# Altium footprint library THU VIEN PCB.PCBLib: 911 footprints (part 24 of 57)
Each footprint in its own frame and in the unit in brackets; x right, y up, seen from the top. Pads: shape width x height; smd on the part's side, far side on the other; paste and mask are expansions set on the pad; w line width, h text height; cw(c..) or ccw(c..) is an arc to the next point about the centre after c.
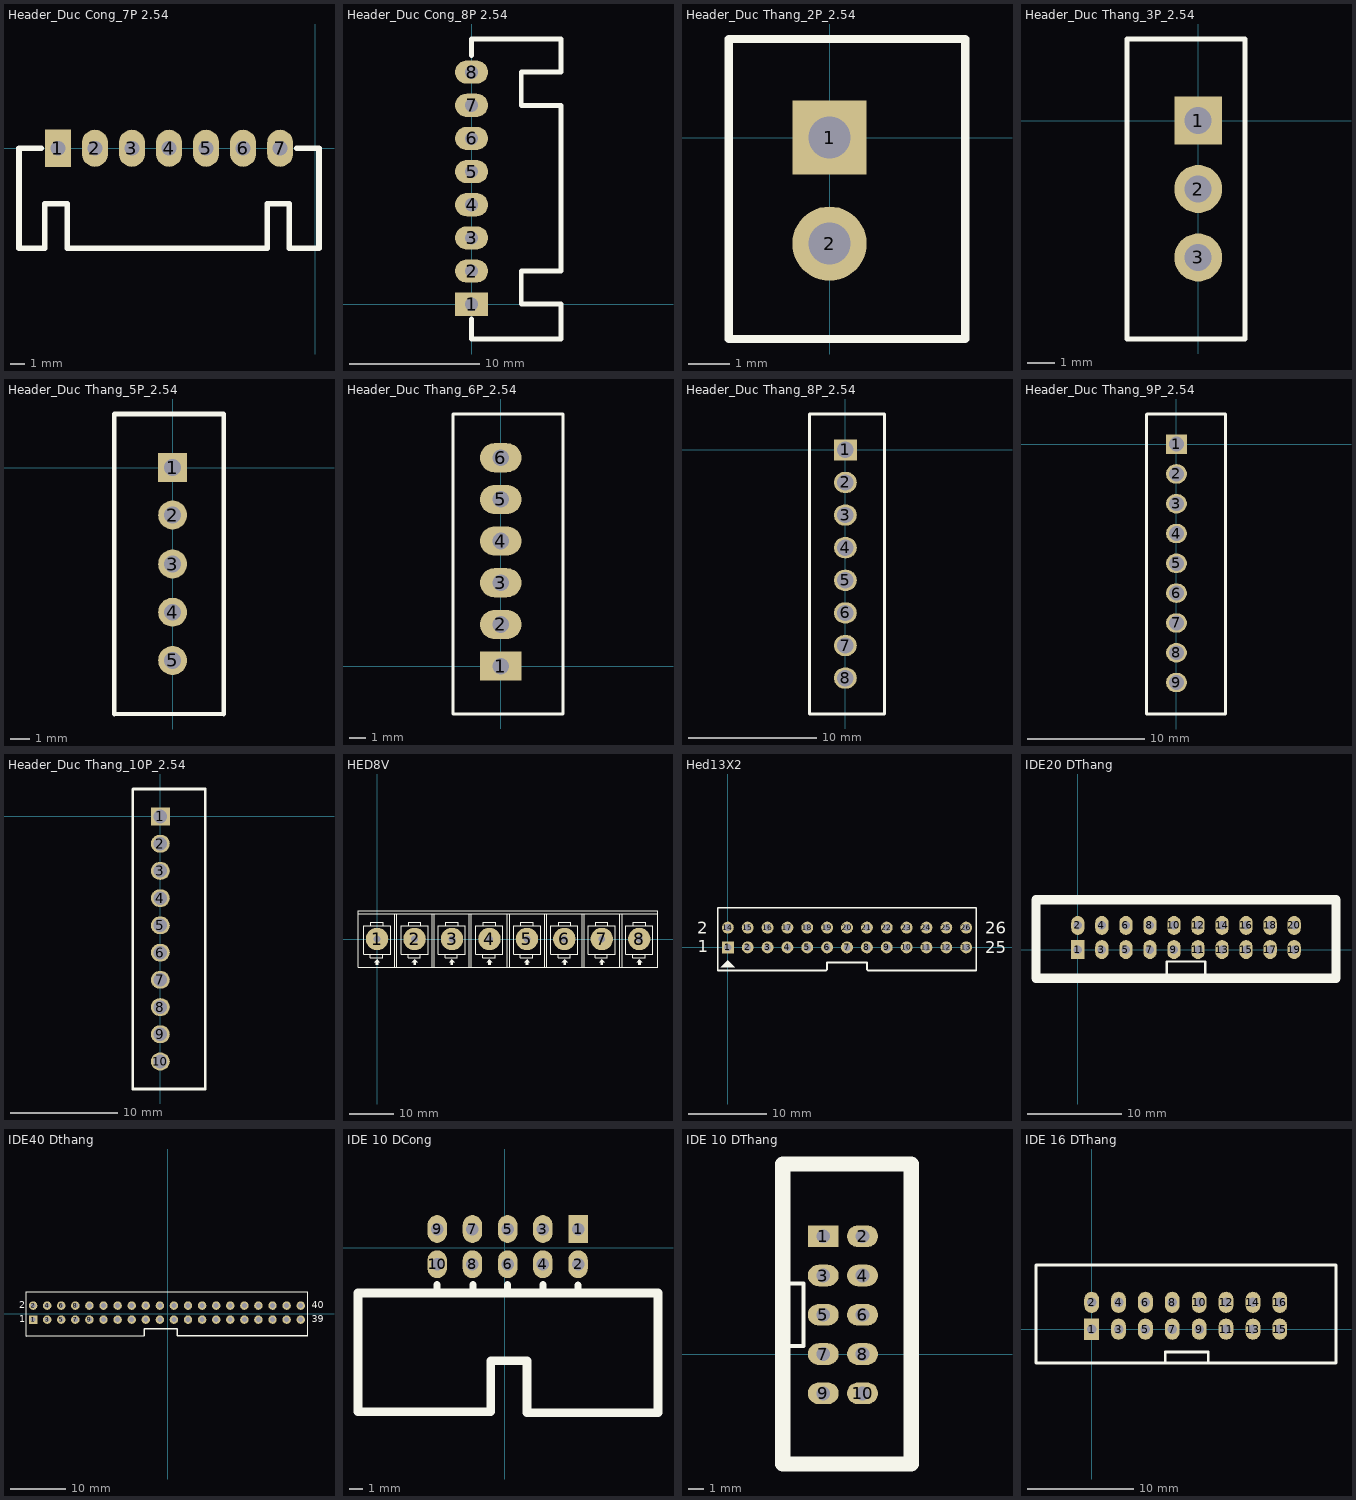
[diagram p23: the footprints below, top view; thin cyan lines are the x and y axes]

## Header_Duc Cong_7P 2.54 [mil]
pads (7):
  rect 70x100 hole 40: 1(-694.96,0)
  oval 70x100 hole 40: 2(-594.96,0) 3(-494.96,0) 4(-394.96,0) 5(-294.96,0) 6(-194.96,0) 7(-94.96,0)
Top Overlay:
  lines w15: -740,0 -800,0 -800,-270 -730,-270 -730,-150 -670,-150 -670,-270 -130,-270 -130,-150 -70,-150 -70,-270 10,-270 10,0 -50,0
3D body "header 7.stp": height 236.72, standoff 0.5, extent -788.7,-270.59 -1.3,5

## Header_Duc Cong_8P 2.54 [mil]
pads (8):
  rect 100x70 hole 40: 1(0,0)
  oval 100x70 hole 40: 2(0,100) 3(0,200) 4(0,300) 5(0,400) 6(0,500) 7(0,600) 8(0,700)
Top Overlay:
  lines w15: 0,-45.04 0,-105.04 270,-105.04 270,0 150,0 150,100 270,100 270,600 150,600 150,700 270,700 270,800 0,800 0,750

## Header_Duc Thang_2P_2.54 [mil]
pads (2):
  rect 70x70 hole 39.37 unplated: 1(0,0)
  round 70 hole 39.37 unplated: 2(0,-100)
Top Overlay:
  lines w7.87: -95,-190 -95,93 128,93 128,-190 -95,-190
3D body "Con 2.stp.step": height 236.82, standoff -133.26, extent -70,-160.14 107.16,72.14

## Header_Duc Thang_3P_2.54 [mil]
pads (3):
  rect 70x70 hole 39.37 unplated: 1(0,0)
  round 70 hole 39.37 unplated: 2(0,-100) 3(0,-200)
Top Overlay:
  lines w7.87: -104,-319 -104,119 68.31,119 68.31,-319 -104,-319

## Header_Duc Thang_5P_2.54 [mil]
pads (5):
  rect 60x60 hole 35: 1(0,0)
  round 60 hole 35: 2(0,-98.42) 3(0,-200) 4(0,-300) 5(0,-400)
Top Overlay:
  lines w7.87: -121,-511 106,-511
  lines w10: -121,-511 -121,111 106,111 106,-511
3D body "Header 5P Thang.stp": height 570, standoff -109, extent -119.5,-510 107,110

## Header_Duc Thang_6P_2.54 [mil] "Header 6P X2.54 Duc Thang"
pads (6):
  rect 100x70 hole 40: 1(0,0)
  oval 100x70 hole 40: 2(0,100) 3(0,200) 4(0,300) 5(0,400) 6(0,500)
Top Overlay:
  lines w7: -115,-115 -115,605 150,605 150,-115 -115,-115
3D body "31502.stp": height 549.5, standoff -129.5, extent -114.5,-115 112,605

## Header_Duc Thang_8P_2.54 [mil]
pads (8):
  rect 70x65 hole 50: 1(0,0)
  oval 70x65 hole 50: 2(0,-100) 3(0,-200) 4(0,-300) 5(0,-400) 6(0,-500) 7(0,-600) 8(0,-700)
Top Overlay:
  lines w10: -110,-810 -110,110 120,110 120,-810 -110,-810
3D body "Header 10 2.54 duc thang.stp": height 550, standoff -129, extent -110,-810 116.5,110

## Header_Duc Thang_9P_2.54 [mil]
pads (9):
  rect 70x65 hole 50: 1(0,0)
  oval 70x65 hole 50: 2(0,-100) 3(0,-200) 4(0,-300) 5(0,-400) 6(0,-500) 7(0,-600) 8(0,-700) 9(0,-800)
Top Overlay:
  lines w10: -101,-905.51 -101,99 -99,101 165,101 165,-905.51 -101,-905.51

## Header_Duc Thang_10P_2.54 [mil]
pads (10):
  rect 70x65 hole 50: 1(0,0)
  oval 70x65 hole 50: 2(0,-100) 3(0,-200) 4(0,-300) 5(0,-400) 6(0,-500) 7(0,-600) 8(0,-700) 9(0,-800) 10(0,-900)
Top Overlay:
  lines w10: -101,-1001 -101,99 -99,101 165,101 165,-1001 -101,-1001
3D body "31550.stp": height 550, standoff -115, extent -98,-1000 162,100

## HED8V [mil] "Header 6"
height 300
pads (8):
  round 200 hole 60: 1(0,0) 2(333.33,0) 3(666.67,0) 4(1000,0) 5(1333.33,0) 6(1666.67,0) 7(2000,0) 8(2333.33,0)
Top Overlay:
  drawing of 107 lines, arcs and shapes, not listed

## Hed13X2 [mil] "Header 13x2,26 pin, connecter"
pads (26):
  rect 60x60 hole 36: 1(0,0)
  round 60 hole 36: 2(100,0) 3(200,0) 4(300,0) 5(400,0) 6(500,0) 7(600,0) 8(700,0) 9(800,0) 10(900,0) 11(1000,0) 12(1100,0) 13(1200,0) 14(0,100) 15(100,100) 16(200,100) 17(300,100) 18(400,100) 19(500,100) 20(600,100) 21(700,100) 22(800,100) 23(900,100) 24(1000,100) 25(1100,100) 26(1200,100)
Top Overlay:
  region: 0,-65 -35,-100 35,-100
  lines w8: -50,-115 -50,200 1250,200 1250,-115
  lines w10: -50,-115 495,-115 500,-110 500,-75 700,-75 700,-110 705,-115 1250,-115
  text "1" at -150,-25 h60
  text "2" at -155,70 h60
  text "25" at 1295,-30 h60
  text "26" at 1295,70 h60

## IDE20 DThang [mm] "Connector; Header; 5x2 Position"
pads (20):
  rect 1.4x2 hole 0.9: 1(0,0)
  oval 1.4x2 hole 0.9: 2(0,2.54) 3(2.54,0) 4(2.54,2.54) 5(5.08,0) 6(5.08,2.54) 7(7.62,0) 8(7.62,2.54) 9(10.16,0) 10(10.16,2.54) 11(12.7,0) 12(12.7,2.54) 13(15.24,0) 14(15.24,2.54) 15(17.78,0) 16(17.78,2.54) 17(20.32,0) 18(20.32,2.54) 19(22.86,0) 20(22.86,2.54)
Top Overlay:
  lines w0.254: 9.398,-2.54 9.398,-1.27 13.462,-1.27 13.462,-2.794
  lines w1: 8.28,-3.048 27.28,-3.048 27.28,5.27 8.28,5.27 ; 14.58,-3.048 -4.42,-3.048 -4.42,5.27 14.58,5.27
3D body "User Library-HDB-20.step": height 9.3, standoff -2.5, extent -5.02,-3.63 27.88,5.77

## IDE40 Dthang [mil]
pads (40):
  rect 60x60 hole 35 unplated: 1(-955.2,-43.54)
  round 60 hole 35 unplated: 2(-955.2,56.46) 3(-855.2,-43.54) 4(-855.2,56.46) 5(-755.2,-43.54) 6(-755.2,56.46) 7(-655.2,-43.54) 8(-655.2,56.46) 9(-555.2,-43.54) 10(-555.2,56.46) 11(-455.2,-43.54) 12(-455.2,56.46) 13(-355.2,-43.54) 14(-355.2,56.46) 15(-255.2,-43.54) 16(-255.2,56.46) 17(-155.2,-43.54) 18(-155.2,56.46) 19(-55.2,-43.54) 20(-55.2,56.46) 21(44.8,-43.54) 22(44.8,56.46) 23(144.8,-43.54) 24(144.8,56.46) 25(244.8,-43.54) 26(244.8,56.46) 27(344.8,-43.54) 28(344.8,56.46) 29(444.8,-43.54) 30(444.8,56.46) 31(544.8,-43.54) 32(544.8,56.46) 33(644.8,-43.54) 34(644.8,56.46) 35(744.8,-43.54) 36(744.8,56.46) 37(844.8,-43.54) 38(844.8,56.46) 39(944.8,-43.54) 40(944.8,56.46)
Top Overlay:
  lines w7.87: -1005.2,-162.44 -1005.2,155.67 994.8,155.67 994.09,-157.48
  lines w10: -1005.2,-162.44 -167.32,-157.48 -167.32,-127.95 -167.32,-108.27 68.9,-108.27 68.9,-157.48 994.09,-157.48
  text "1" at -1055.2,-63.54 h50
  text "2" at -1055.2,36.46 h50
  text "40" at 1024.8,36.46 h50
  text "39" at 1024.8,-63.54 h50

## IDE 10 DCong [mm]
pads (10):
  rect 1.4x2 hole 0.9: 1(5.283,1.346)
  oval 1.4x2 hole 0.9: 2(5.283,-1.194) 3(2.743,1.346) 4(2.743,-1.194) 5(0.203,1.346) 6(0.203,-1.194) 7(-2.337,1.346) 8(-2.337,-1.194) 9(-4.877,1.346) 10(-4.877,-1.194)
Top Overlay:
  lines w0.508: -4.877,-3.327 -4.826,-3.327 ; -4.877,-3.2 -4.877,-2.642 ; -2.286,-2.667 -2.286,-3.2 -2.261,-3.2 ; 0.203,-3.251 0.203,-2.667 ; 2.743,-2.667 2.743,-3.226 2.845,-3.226 ; 5.283,-2.692 5.283,-3.302 5.41,-3.302
  lines w0.635: 11.024,-11.913 1.6,-11.913 1.6,-8.153 -1.016,-8.153 -1.016,-11.836 -10.592,-11.836 -10.592,-3.277 11.049,-3.277 11.049,-11.887
3D body "IDC 10 CONG.step": height 8.47, standoff -2.88, extent -10.242,-11.862 10.698,1.698

## IDE 10 DThang [mm] "Connector; Header; 5x2 Position"
pads (10):
  rect 2x1.4 hole 0.9: 1(10.16,7.62)
  oval 2x1.4 hole 0.9: 2(12.7,7.62) 3(10.16,5.08) 4(12.7,5.08) 5(10.16,2.54) 6(12.7,2.54) 7(10.16,0) 8(12.7,0) 9(10.16,-2.54) 10(12.7,-2.54)
Top Overlay:
  lines w0.254: 7.874,0.508 8.89,0.508 8.89,0.762 8.89,4.572 7.874,4.572
  lines w1: 7.544,-7.112 15.85,-7.112 15.85,12.294 7.544,12.294 7.544,-7.112
3D body "IDE 10.STEP": height 9.44, standoff -3.26, extent 7.036,-7.584 16.386,12.816

## IDE 16 DThang [mm]
pads (16):
  rect 1.4x2 hole 0.9: 1(0,0)
  oval 1.4x2 hole 0.9: 2(0,2.54) 3(2.54,0) 4(2.54,2.54) 5(5.08,0) 6(5.08,2.54) 7(7.62,0) 8(7.62,2.54) 9(10.16,0) 10(10.16,2.54) 11(12.7,0) 12(12.7,2.54) 13(15.24,0) 14(15.24,2.54) 15(17.78,0) 16(17.78,2.54)
Top Overlay:
  lines w0.254: 6.964,-3.199 6.964,-2.163 11.028,-2.163 11.028,-3.199 ; -5.258,-3.2 23.089,-3.2 23.089,6.071 -5.258,6.071 -5.258,-3.2
3D body "User Library-IDC Socket Male 16pin Straight THT Goldplated 2_54mm.STEP": height 8.91, standoff -3.49, extent -5.06,-3 22.86,5.85